# Altium schematic symbol library MCU_Microchip_ATmega.SchLib: 440 symbols (part 6 of 9)
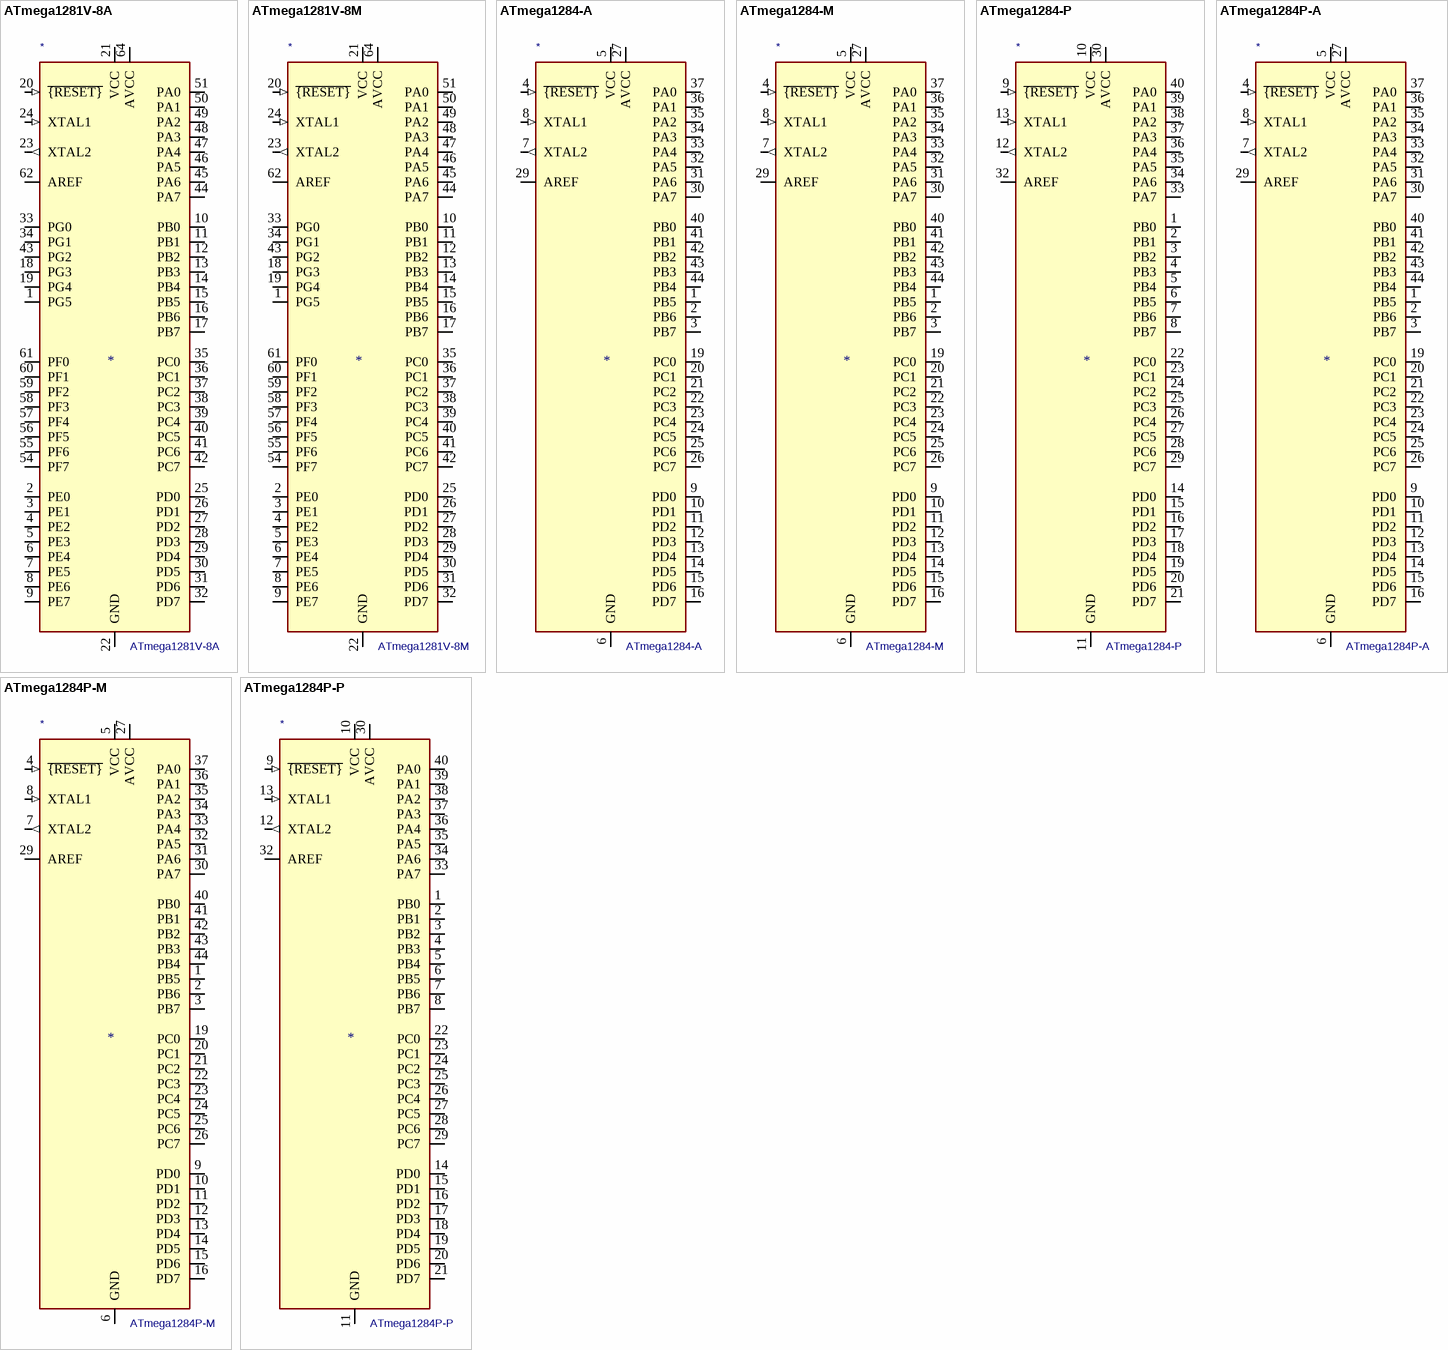
[diagram p45: symbols ATmega1281V-8A to ATmega1284P-P]

## ATmega1284P-P
designator *  value ATmega1284P-P
ki_keywords: AVR 8bit Microcontroller MegaAVR PicoPower; ki_description: 20MHz, 128kB Flash, 16kB SRAM, 4kB EEPROM, JTAG, DIP-40; ki_fp_filters: DIP*W15.24mm*; Footprint: Package_DIP:DIP-40_W15.24mm; Supplier: http://ww1.microchip.com/downloads/en/DeviceDoc/Atmel-8272-8-bit-AVR-microcontroller-ATmega164A_PA-324A_PA-644A_PA-1284_P_datasheet.pdf
footprint DIP-40_W15.24mm
pins: 1 PB0 (io), 2 PB1 (io), 3 PB2 (io), 4 PB3 (io), 5 PB4 (io), 6 PB5 (io), 7 PB6 (io), 8 PB7 (io), 9 ~{{RESET}} (in), 10 VCC (power), 11 GND (power), 12 XTAL2 (out), 13 XTAL1 (in), 14 PD0 (io), 15 PD1 (io), 16 PD2 (io), 17 PD3 (io), 18 PD4 (io), 19 PD5 (io), 20 PD6 (io), 21 PD7 (io), 22 PC0 (io), 23 PC1 (io), 24 PC2 (io), 25 PC3 (io), 26 PC4 (io), 27 PC5 (io), 28 PC6 (io), 29 PC7 (io), 30 AVCC (power), 31 GND hidden, 32 AREF, 33 PA7 (io), 34 PA6 (io), 35 PA5 (io), 36 PA4 (io), 37 PA3 (io), 38 PA2 (io), 39 PA1 (io), 40 PA0 (io)

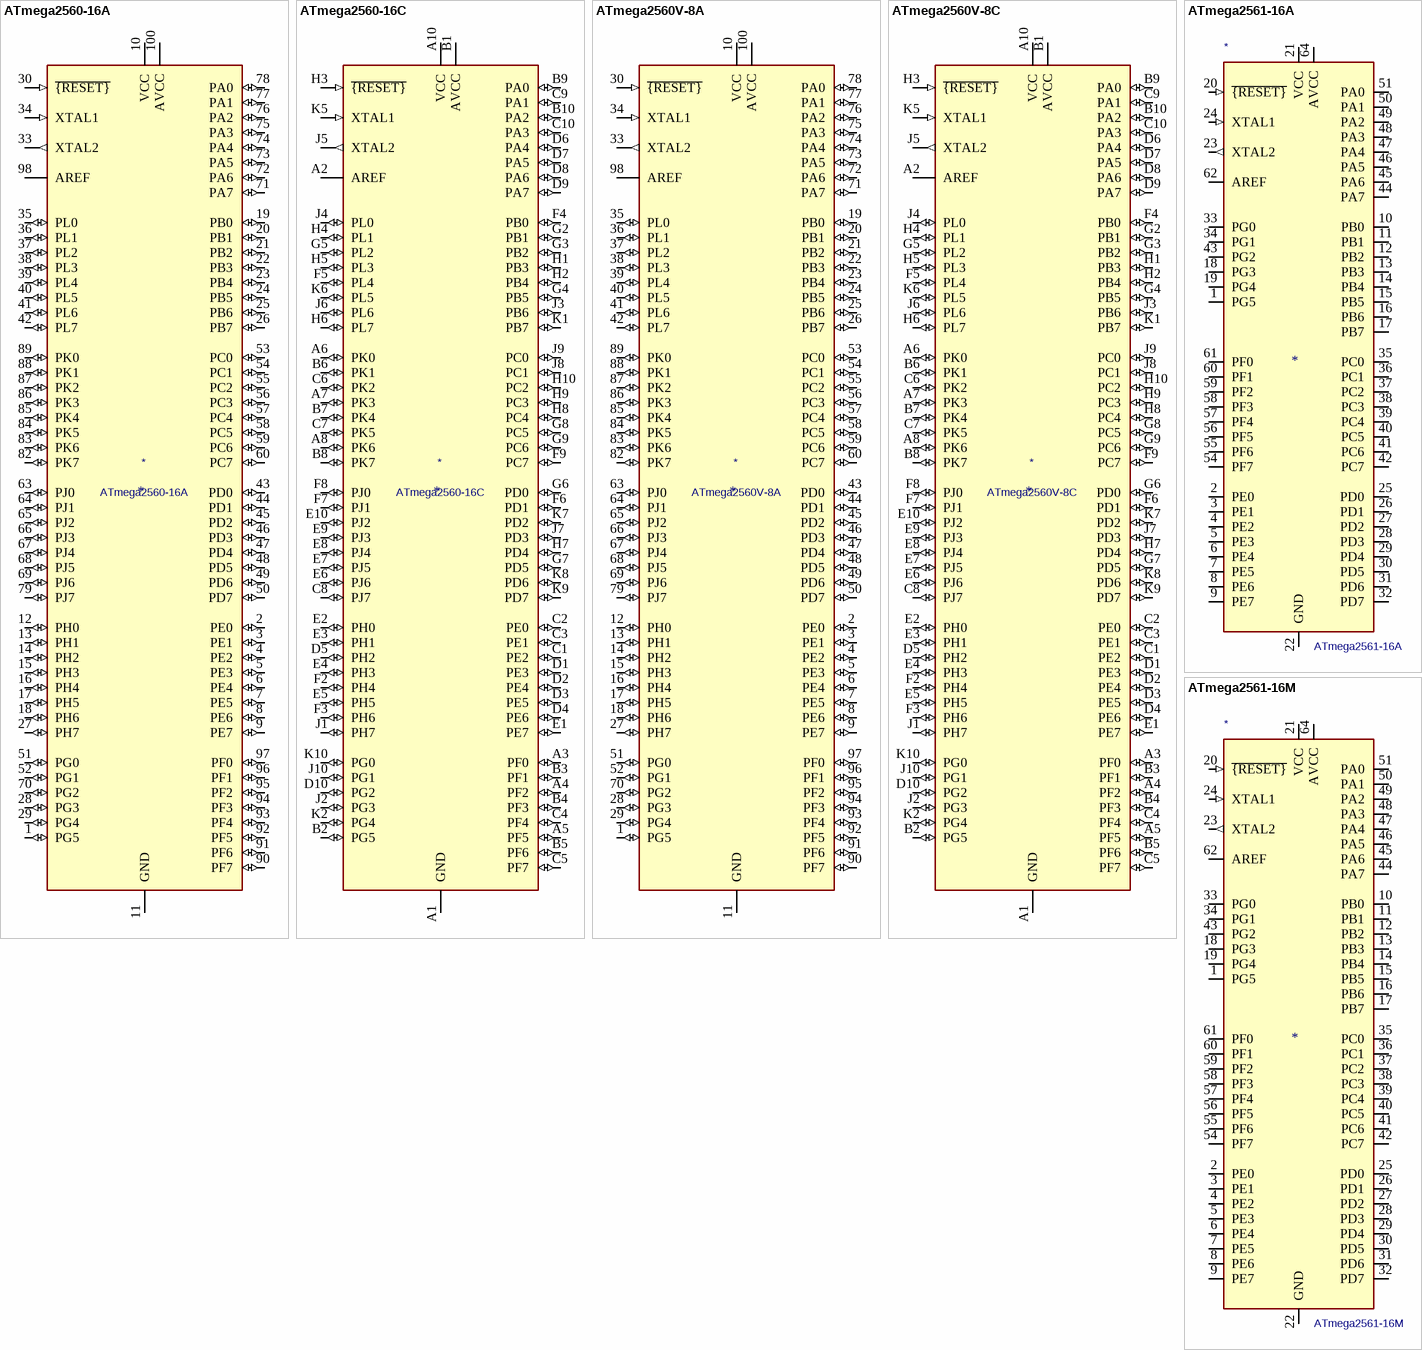
[diagram p24: symbols ATmega2560-16A to ATmega2561-16M]

## ATmega2560-16A
designator *  value ATmega2560-16A
ki_keywords: AVR 8bit Microcontroller MegaAVR; ki_description: 16MHz, 256kB Flash, 8kB SRAM, 4kB EEPROM, JTAG, TQFP-100; ki_fp_filters: TQFP*14x14mm*P0.5mm*; Footprint: Package_QFP:TQFP-100_14x14mm_P0.5mm; Supplier: http://ww1.microchip.com/downloads/en/DeviceDoc/Atmel-2549-8-bit-AVR-Microcontroller-ATmega640-1280-1281-2560-2561_datasheet.pdf
footprint TQFP-100_14x14mm_P0.5mm
pins: 1 PG5 (io), 2 PE0 (io), 3 PE1 (io), 4 PE2 (io), 5 PE3 (io), 6 PE4 (io), 7 PE5 (io), 8 PE6 (io), 9 PE7 (io), 10 VCC (power), 11 GND (power), 12 PH0 (io), 13 PH1 (io), 14 PH2 (io), 15 PH3 (io), 16 PH4 (io), 17 PH5 (io), 18 PH6 (io), 19 PB0 (io), 20 PB1 (io), 21 PB2 (io), 22 PB3 (io), 23 PB4 (io), 24 PB5 (io), 25 PB6 (io), 26 PB7 (io), 27 PH7 (io), 28 PG3 (io), 29 PG4 (io), 30 ~{{RESET}} (in), 31 VCC hidden, 32 GND hidden, 33 XTAL2 (out), 34 XTAL1 (in), 35 PL0 (io), 36 PL1 (io), 37 PL2 (io), 38 PL3 (io), 39 PL4 (io), 40 PL5 (io), 41 PL6 (io), 42 PL7 (io), 43 PD0 (io), 44 PD1 (io), 45 PD2 (io), 46 PD3 (io), 47 PD4 (io), 48 PD5 (io), 49 PD6 (io), 50 PD7 (io), 51 PG0 (io), 52 PG1 (io), 53 PC0 (io), 54 PC1 (io), 55 PC2 (io), 56 PC3 (io), 57 PC4 (io), 58 PC5 (io), 59 PC6 (io), 60 PC7 (io), 61 VCC hidden, 62 GND hidden, 63 PJ0 (io), 64 PJ1 (io), 65 PJ2 (io), 66 PJ3 (io), 67 PJ4 (io), 68 PJ5 (io), 69 PJ6 (io), 70 PG2 (io), 71 PA7 (io), 72 PA6 (io), 73 PA5 (io), 74 PA4 (io), 75 PA3 (io), 76 PA2 (io), 77 PA1 (io), 78 PA0 (io), 79 PJ7 (io), 80 VCC hidden, 81 GND hidden, 82 PK7 (io), 83 PK6 (io), 84 PK5 (io), 85 PK4 (io), 86 PK3 (io), 87 PK2 (io), 88 PK1 (io), 89 PK0 (io), 90 PF7 (io), 91 PF6 (io), 92 PF5 (io), 93 PF4 (io), 94 PF3 (io), 95 PF2 (io), 96 PF1 (io), 97 PF0 (io), 98 AREF, 99 GND hidden, 100 AVCC (power)

## ATmega2560-16C
designator *  value ATmega2560-16C
ki_keywords: AVR 8bit Microcontroller MegaAVR; ki_description: 16MHz, 256kB Flash, 8kB SRAM, 4kB EEPROM, JTAG, TFBGA-100; ki_fp_filters: TFBGA*9.0x9.0mm*Layout10x10*P0.8mm*; Footprint: Package_BGA:TFBGA-100_9.0x9.0mm_Layout10x10_P0.8mm; Supplier: http://ww1.microchip.com/downloads/en/DeviceDoc/Atmel-2549-8-bit-AVR-Microcontroller-ATmega640-1280-1281-2560-2561_datasheet.pdf
footprint TFBGA-100_9.0x9.0mm_Layout10x10_P0.8mm
pins: A1 GND (power), A2 AREF, A3 PF0 (io), A4 PF2 (io), A5 PF5 (io), A6 PK0 (io), A7 PK3 (io), A8 PK6 (io), A9 GND hidden, A10 VCC (power), B1 AVCC (power), B2 PG5 (io), B3 PF1 (io), B4 PF3 (io), B5 PF6 (io), B6 PK1 (io), B7 PK4 (io), B8 PK7 (io), B9 PA0 (io), B10 PA2 (io), C1 PE2 (io), C2 PE0 (io), C3 PE1 (io), C4 PF4 (io), C5 PF7 (io), C6 PK2 (io), C7 PK5 (io), C8 PJ7 (io), C9 PA1 (io), C10 PA3 (io), D1 PE3 (io), D2 PE4 (io), D3 PE5 (io), D4 PE6 (io), D5 PH2 (io), D6 PA4 (io), D7 PA5 (io), D8 PA6 (io), D9 PA7 (io), D10 PG2 (io), E1 PE7 (io), E2 PH0 (io), E3 PH1 (io), E4 PH3 (io), E5 PH5 (io), E6 PJ6 (io), E7 PJ5 (io), E8 PJ4 (io), E9 PJ3 (io), E10 PJ2 (io), F1 VCC hidden, F2 PH4 (io), F3 PH6 (io), F4 PB0 (io), F5 PL4 (io), F6 PD1 (io), F7 PJ1 (io), F8 PJ0 (io), F9 PC7 (io), F10 GND hidden, G1 GND hidden, G2 PB1 (io), G3 PB2 (io), G4 PB5 (io), G5 PL2 (io), G6 PD0 (io), G7 PD5 (io), G8 PC5 (io), G9 PC6 (io), G10 VCC hidden, H1 PB3 (io), H2 PB4 (io), H3 ~{{RESET}} (in), H4 PL1 (io), H5 PL3 (io), H6 PL7 (io), H7 PD4 (io), H8 PC4 (io), H9 PC3 (io), H10 PC2 (io), J1 PH7 (io), J2 PG3 (io), J3 PB6 (io), J4 PL0 (io), J5 XTAL2 (out), J6 PL6 (io), J7 PD3 (io), J8 PC1 (io), J9 PC0 (io), J10 PG1 (io), K1 PB7 (io), K2 PG4 (io), K3 VCC hidden, K4 GND hidden, K5 XTAL1 (in), K6 PL5 (io), K7 PD2 (io), K8 PD6 (io), K9 PD7 (io), K10 PG0 (io)

## ATmega2560V-8A
designator *  value ATmega2560V-8A
ki_keywords: AVR 8bit Microcontroller MegaAVR; ki_description: 8MHz, 256kB Flash, 8kB SRAM, 4kB EEPROM, JTAG, TQFP-100; ki_fp_filters: TQFP*14x14mm*P0.5mm*; Footprint: Package_QFP:TQFP-100_14x14mm_P0.5mm; Supplier: http://ww1.microchip.com/downloads/en/DeviceDoc/Atmel-2549-8-bit-AVR-Microcontroller-ATmega640-1280-1281-2560-2561_datasheet.pdf
footprint TQFP-100_14x14mm_P0.5mm
pins: 1 PG5 (io), 2 PE0 (io), 3 PE1 (io), 4 PE2 (io), 5 PE3 (io), 6 PE4 (io), 7 PE5 (io), 8 PE6 (io), 9 PE7 (io), 10 VCC (power), 11 GND (power), 12 PH0 (io), 13 PH1 (io), 14 PH2 (io), 15 PH3 (io), 16 PH4 (io), 17 PH5 (io), 18 PH6 (io), 19 PB0 (io), 20 PB1 (io), 21 PB2 (io), 22 PB3 (io), 23 PB4 (io), 24 PB5 (io), 25 PB6 (io), 26 PB7 (io), 27 PH7 (io), 28 PG3 (io), 29 PG4 (io), 30 ~{{RESET}} (in), 31 VCC hidden, 32 GND hidden, 33 XTAL2 (out), 34 XTAL1 (in), 35 PL0 (io), 36 PL1 (io), 37 PL2 (io), 38 PL3 (io), 39 PL4 (io), 40 PL5 (io), 41 PL6 (io), 42 PL7 (io), 43 PD0 (io), 44 PD1 (io), 45 PD2 (io), 46 PD3 (io), 47 PD4 (io), 48 PD5 (io), 49 PD6 (io), 50 PD7 (io), 51 PG0 (io), 52 PG1 (io), 53 PC0 (io), 54 PC1 (io), 55 PC2 (io), 56 PC3 (io), 57 PC4 (io), 58 PC5 (io), 59 PC6 (io), 60 PC7 (io), 61 VCC hidden, 62 GND hidden, 63 PJ0 (io), 64 PJ1 (io), 65 PJ2 (io), 66 PJ3 (io), 67 PJ4 (io), 68 PJ5 (io), 69 PJ6 (io), 70 PG2 (io), 71 PA7 (io), 72 PA6 (io), 73 PA5 (io), 74 PA4 (io), 75 PA3 (io), 76 PA2 (io), 77 PA1 (io), 78 PA0 (io), 79 PJ7 (io), 80 VCC hidden, 81 GND hidden, 82 PK7 (io), 83 PK6 (io), 84 PK5 (io), 85 PK4 (io), 86 PK3 (io), 87 PK2 (io), 88 PK1 (io), 89 PK0 (io), 90 PF7 (io), 91 PF6 (io), 92 PF5 (io), 93 PF4 (io), 94 PF3 (io), 95 PF2 (io), 96 PF1 (io), 97 PF0 (io), 98 AREF, 99 GND hidden, 100 AVCC (power)

## ATmega2560V-8C
designator *  value ATmega2560V-8C
ki_keywords: AVR 8bit Microcontroller MegaAVR; ki_description: 8MHz, 256kB Flash, 8kB SRAM, 4kB EEPROM, JTAG, TFBGA-100; ki_fp_filters: TFBGA*9.0x9.0mm*Layout10x10*P0.8mm*; Footprint: Package_BGA:TFBGA-100_9.0x9.0mm_Layout10x10_P0.8mm; Supplier: http://ww1.microchip.com/downloads/en/DeviceDoc/Atmel-2549-8-bit-AVR-Microcontroller-ATmega640-1280-1281-2560-2561_datasheet.pdf
footprint TFBGA-100_9.0x9.0mm_Layout10x10_P0.8mm
pins: A1 GND (power), A2 AREF, A3 PF0 (io), A4 PF2 (io), A5 PF5 (io), A6 PK0 (io), A7 PK3 (io), A8 PK6 (io), A9 GND hidden, A10 VCC (power), B1 AVCC (power), B2 PG5 (io), B3 PF1 (io), B4 PF3 (io), B5 PF6 (io), B6 PK1 (io), B7 PK4 (io), B8 PK7 (io), B9 PA0 (io), B10 PA2 (io), C1 PE2 (io), C2 PE0 (io), C3 PE1 (io), C4 PF4 (io), C5 PF7 (io), C6 PK2 (io), C7 PK5 (io), C8 PJ7 (io), C9 PA1 (io), C10 PA3 (io), D1 PE3 (io), D2 PE4 (io), D3 PE5 (io), D4 PE6 (io), D5 PH2 (io), D6 PA4 (io), D7 PA5 (io), D8 PA6 (io), D9 PA7 (io), D10 PG2 (io), E1 PE7 (io), E2 PH0 (io), E3 PH1 (io), E4 PH3 (io), E5 PH5 (io), E6 PJ6 (io), E7 PJ5 (io), E8 PJ4 (io), E9 PJ3 (io), E10 PJ2 (io), F1 VCC hidden, F2 PH4 (io), F3 PH6 (io), F4 PB0 (io), F5 PL4 (io), F6 PD1 (io), F7 PJ1 (io), F8 PJ0 (io), F9 PC7 (io), F10 GND hidden, G1 GND hidden, G2 PB1 (io), G3 PB2 (io), G4 PB5 (io), G5 PL2 (io), G6 PD0 (io), G7 PD5 (io), G8 PC5 (io), G9 PC6 (io), G10 VCC hidden, H1 PB3 (io), H2 PB4 (io), H3 ~{{RESET}} (in), H4 PL1 (io), H5 PL3 (io), H6 PL7 (io), H7 PD4 (io), H8 PC4 (io), H9 PC3 (io), H10 PC2 (io), J1 PH7 (io), J2 PG3 (io), J3 PB6 (io), J4 PL0 (io), J5 XTAL2 (out), J6 PL6 (io), J7 PD3 (io), J8 PC1 (io), J9 PC0 (io), J10 PG1 (io), K1 PB7 (io), K2 PG4 (io), K3 VCC hidden, K4 GND hidden, K5 XTAL1 (in), K6 PL5 (io), K7 PD2 (io), K8 PD6 (io), K9 PD7 (io), K10 PG0 (io)

## ATmega2561-16A
designator *  value ATmega2561-16A
ki_keywords: AVR 8bit Microcontroller MegaAVR; ki_description: 16MHz, 256kB Flash, 8kB SRAM, 4kB EEPROM, JTAG, TQFP-64; ki_fp_filters: TQFP*14x14mm*P0.8mm*; Footprint: Package_QFP:TQFP-64_14x14mm_P0.8mm; Supplier: http://ww1.microchip.com/downloads/en/DeviceDoc/Atmel-2549-8-bit-AVR-Microcontroller-ATmega640-1280-1281-2560-2561_datasheet.pdf
footprint TQFP-64_14x14mm_P0.8mm
pins: 1 PG5 (io), 2 PE0 (io), 3 PE1 (io), 4 PE2 (io), 5 PE3 (io), 6 PE4 (io), 7 PE5 (io), 8 PE6 (io), 9 PE7 (io), 10 PB0 (io), 11 PB1 (io), 12 PB2 (io), 13 PB3 (io), 14 PB4 (io), 15 PB5 (io), 16 PB6 (io), 17 PB7 (io), 18 PG3 (io), 19 PG4 (io), 20 ~{{RESET}} (in), 21 VCC (power), 22 GND (power), 23 XTAL2 (out), 24 XTAL1 (in), 25 PD0 (io), 26 PD1 (io), 27 PD2 (io), 28 PD3 (io), 29 PD4 (io), 30 PD5 (io), 31 PD6 (io), 32 PD7 (io), 33 PG0 (io), 34 PG1 (io), 35 PC0 (io), 36 PC1 (io), 37 PC2 (io), 38 PC3 (io), 39 PC4 (io), 40 PC5 (io), 41 PC6 (io), 42 PC7 (io), 43 PG2 (io), 44 PA7 (io), 45 PA6 (io), 46 PA5 (io), 47 PA4 (io), 48 PA3 (io), 49 PA2 (io), 50 PA1 (io), 51 PA0 (io), 52 VCC hidden, 53 GND hidden, 54 PF7 (io), 55 PF6 (io), 56 PF5 (io), 57 PF4 (io), 58 PF3 (io), 59 PF2 (io), 60 PF1 (io), 61 PF0 (io), 62 AREF, 63 GND hidden, 64 AVCC (power)

## ATmega2561-16M
designator *  value ATmega2561-16M
ki_keywords: AVR 8bit Microcontroller MegaAVR; ki_description: 16MHz, 256kB Flash, 8kB SRAM, 4kB EEPROM, JTAG, QFN-64; ki_fp_filters: QFN*1EP*9x9mm*P0.5mm*; Footprint: Package_DFN_QFN:QFN-64-1EP_9x9mm_P0.5mm_EP7.65x7.65mm; Supplier: http://ww1.microchip.com/downloads/en/DeviceDoc/Atmel-2549-8-bit-AVR-Microcontroller-ATmega640-1280-1281-2560-2561_datasheet.pdf
footprint QFN-64-1EP_9x9mm_P0.5mm_EP7.65x7.65mm
pins: 1 PG5 (io), 2 PE0 (io), 3 PE1 (io), 4 PE2 (io), 5 PE3 (io), 6 PE4 (io), 7 PE5 (io), 8 PE6 (io), 9 PE7 (io), 10 PB0 (io), 11 PB1 (io), 12 PB2 (io), 13 PB3 (io), 14 PB4 (io), 15 PB5 (io), 16 PB6 (io), 17 PB7 (io), 18 PG3 (io), 19 PG4 (io), 20 ~{{RESET}} (in), 21 VCC (power), 22 GND (power), 23 XTAL2 (out), 24 XTAL1 (in), 25 PD0 (io), 26 PD1 (io), 27 PD2 (io), 28 PD3 (io), 29 PD4 (io), 30 PD5 (io), 31 PD6 (io), 32 PD7 (io), 33 PG0 (io), 34 PG1 (io), 35 PC0 (io), 36 PC1 (io), 37 PC2 (io), 38 PC3 (io), 39 PC4 (io), 40 PC5 (io), 41 PC6 (io), 42 PC7 (io), 43 PG2 (io), 44 PA7 (io), 45 PA6 (io), 46 PA5 (io), 47 PA4 (io), 48 PA3 (io), 49 PA2 (io), 50 PA1 (io), 51 PA0 (io), 52 VCC hidden, 53 GND hidden, 54 PF7 (io), 55 PF6 (io), 56 PF5 (io), 57 PF4 (io), 58 PF3 (io), 59 PF2 (io), 60 PF1 (io), 61 PF0 (io), 62 AREF, 63 GND hidden, 64 AVCC (power), 65 GND hidden

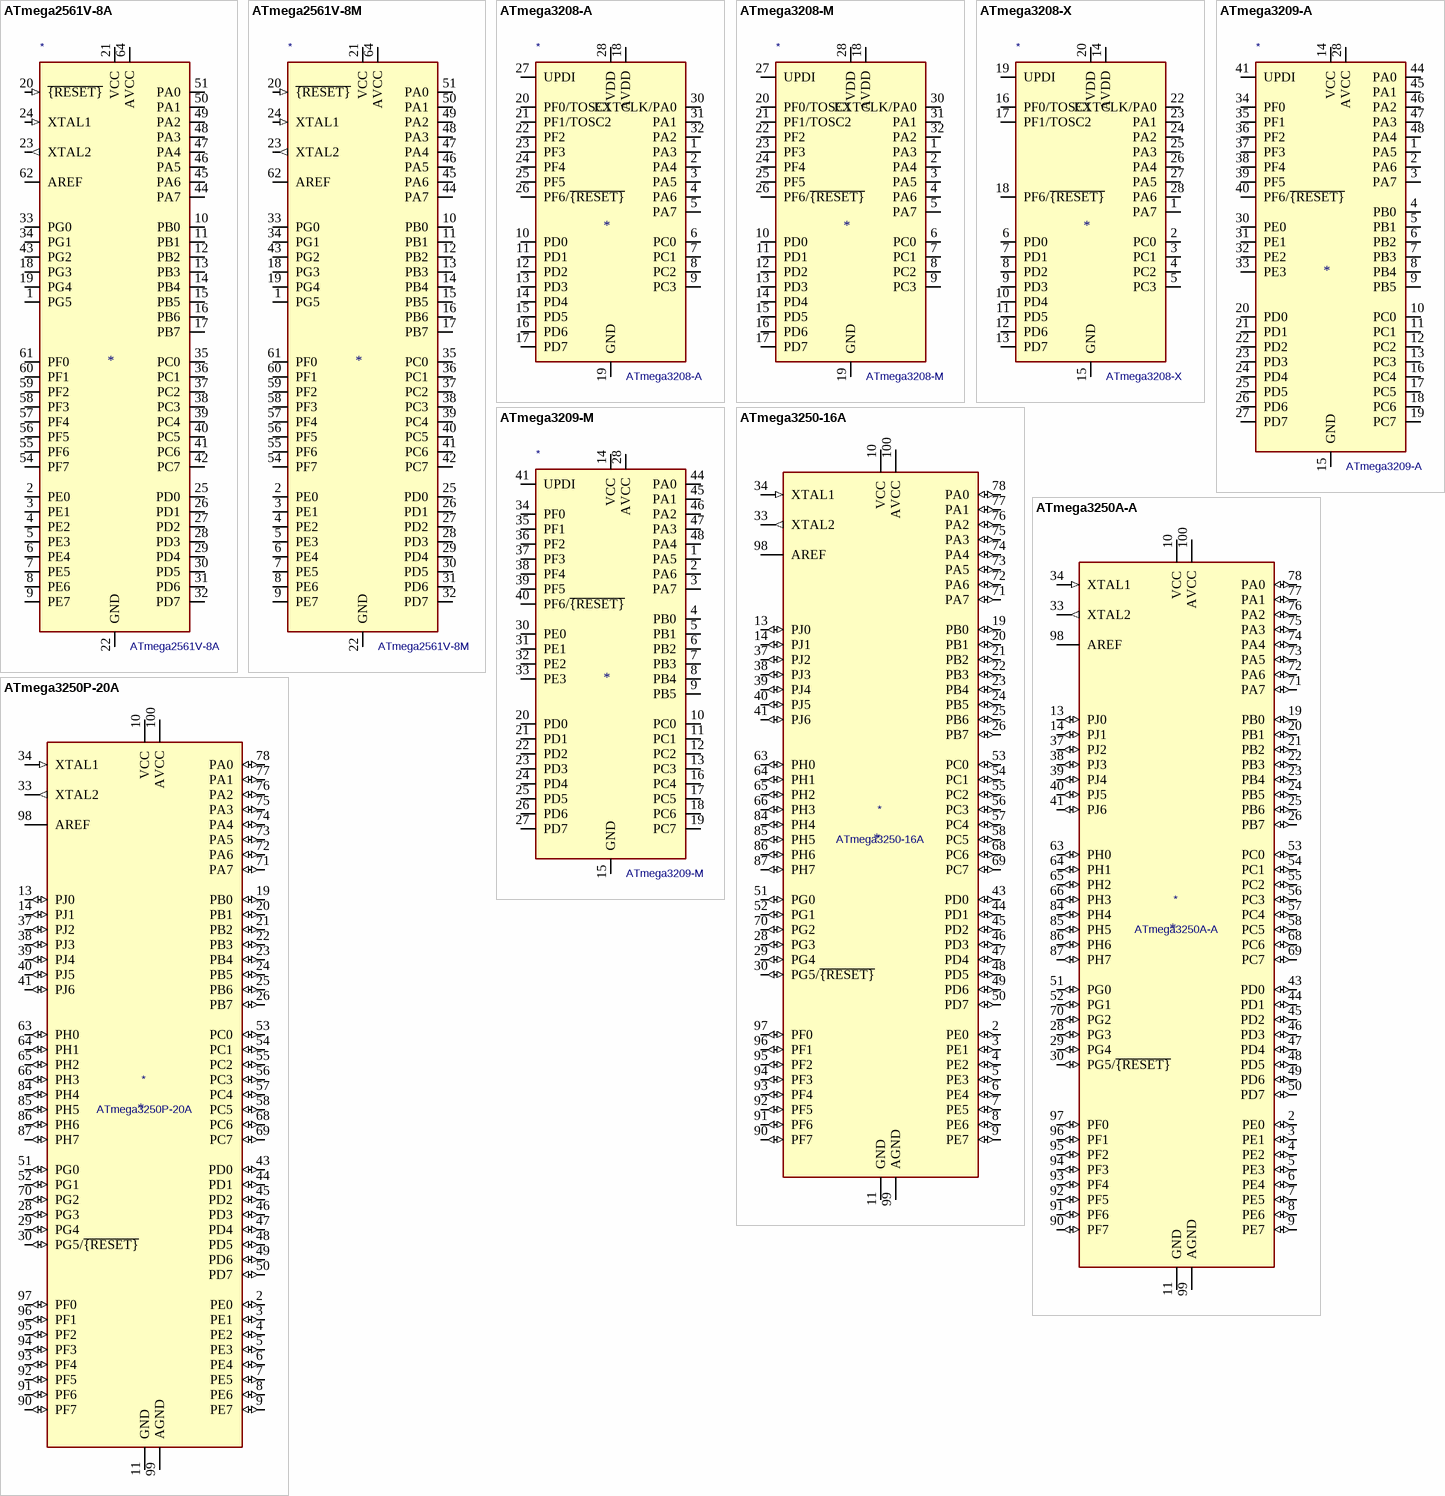
[diagram p25: symbols ATmega2561V-8A to ATmega3250P-20A]

## ATmega2561V-8A
designator *  value ATmega2561V-8A
ki_keywords: AVR 8bit Microcontroller MegaAVR; ki_description: 8MHz, 256kB Flash, 8kB SRAM, 4kB EEPROM, JTAG, TQFP-64; ki_fp_filters: TQFP*14x14mm*P0.8mm*; Footprint: Package_QFP:TQFP-64_14x14mm_P0.8mm; Supplier: http://ww1.microchip.com/downloads/en/DeviceDoc/Atmel-2549-8-bit-AVR-Microcontroller-ATmega640-1280-1281-2560-2561_datasheet.pdf
footprint TQFP-64_14x14mm_P0.8mm
pins: 1 PG5 (io), 2 PE0 (io), 3 PE1 (io), 4 PE2 (io), 5 PE3 (io), 6 PE4 (io), 7 PE5 (io), 8 PE6 (io), 9 PE7 (io), 10 PB0 (io), 11 PB1 (io), 12 PB2 (io), 13 PB3 (io), 14 PB4 (io), 15 PB5 (io), 16 PB6 (io), 17 PB7 (io), 18 PG3 (io), 19 PG4 (io), 20 ~{{RESET}} (in), 21 VCC (power), 22 GND (power), 23 XTAL2 (out), 24 XTAL1 (in), 25 PD0 (io), 26 PD1 (io), 27 PD2 (io), 28 PD3 (io), 29 PD4 (io), 30 PD5 (io), 31 PD6 (io), 32 PD7 (io), 33 PG0 (io), 34 PG1 (io), 35 PC0 (io), 36 PC1 (io), 37 PC2 (io), 38 PC3 (io), 39 PC4 (io), 40 PC5 (io), 41 PC6 (io), 42 PC7 (io), 43 PG2 (io), 44 PA7 (io), 45 PA6 (io), 46 PA5 (io), 47 PA4 (io), 48 PA3 (io), 49 PA2 (io), 50 PA1 (io), 51 PA0 (io), 52 VCC hidden, 53 GND hidden, 54 PF7 (io), 55 PF6 (io), 56 PF5 (io), 57 PF4 (io), 58 PF3 (io), 59 PF2 (io), 60 PF1 (io), 61 PF0 (io), 62 AREF, 63 GND hidden, 64 AVCC (power)

## ATmega2561V-8M
designator *  value ATmega2561V-8M
ki_keywords: AVR 8bit Microcontroller MegaAVR; ki_description: 8MHz, 256kB Flash, 8kB SRAM, 4kB EEPROM, JTAG, QFN-64; ki_fp_filters: QFN*1EP*9x9mm*P0.5mm*; Footprint: Package_DFN_QFN:QFN-64-1EP_9x9mm_P0.5mm_EP7.65x7.65mm; Supplier: http://ww1.microchip.com/downloads/en/DeviceDoc/Atmel-2549-8-bit-AVR-Microcontroller-ATmega640-1280-1281-2560-2561_datasheet.pdf
footprint QFN-64-1EP_9x9mm_P0.5mm_EP7.65x7.65mm
pins: 1 PG5 (io), 2 PE0 (io), 3 PE1 (io), 4 PE2 (io), 5 PE3 (io), 6 PE4 (io), 7 PE5 (io), 8 PE6 (io), 9 PE7 (io), 10 PB0 (io), 11 PB1 (io), 12 PB2 (io), 13 PB3 (io), 14 PB4 (io), 15 PB5 (io), 16 PB6 (io), 17 PB7 (io), 18 PG3 (io), 19 PG4 (io), 20 ~{{RESET}} (in), 21 VCC (power), 22 GND (power), 23 XTAL2 (out), 24 XTAL1 (in), 25 PD0 (io), 26 PD1 (io), 27 PD2 (io), 28 PD3 (io), 29 PD4 (io), 30 PD5 (io), 31 PD6 (io), 32 PD7 (io), 33 PG0 (io), 34 PG1 (io), 35 PC0 (io), 36 PC1 (io), 37 PC2 (io), 38 PC3 (io), 39 PC4 (io), 40 PC5 (io), 41 PC6 (io), 42 PC7 (io), 43 PG2 (io), 44 PA7 (io), 45 PA6 (io), 46 PA5 (io), 47 PA4 (io), 48 PA3 (io), 49 PA2 (io), 50 PA1 (io), 51 PA0 (io), 52 VCC hidden, 53 GND hidden, 54 PF7 (io), 55 PF6 (io), 56 PF5 (io), 57 PF4 (io), 58 PF3 (io), 59 PF2 (io), 60 PF1 (io), 61 PF0 (io), 62 AREF, 63 GND hidden, 64 AVCC (power), 65 GND hidden

## ATmega3208-A
designator *  value ATmega3208-A
ki_keywords: AVR 8bit Microcontroller MegaAVR; ki_description: 20MHz, 32kB Flash, 4kB SRAM, 256B EEPROM, TQFP-32; ki_fp_filters: TQFP*7x7mm*P0.8mm*; Footprint: Package_QFP:TQFP-32_7x7mm_P0.8mm; Supplier: http://ww1.microchip.com/downloads/en/DeviceDoc/40002017A.pdf
footprint TQFP-32_7x7mm_P0.8mm
pins: 1 PA3 (io), 2 PA4 (io), 3 PA5 (io), 4 PA6 (io), 5 PA7 (io), 6 PC0 (io), 7 PC1 (io), 8 PC2 (io), 9 PC3 (io), 10 PD0 (io), 11 PD1 (io), 12 PD2 (io), 13 PD3 (io), 14 PD4 (io), 15 PD5 (io), 16 PD6 (io), 17 PD7 (io), 18 AVDD (power), 19 GND (power), 20 PF0/TOSC1 (io), 21 PF1/TOSC2 (io), 22 PF2 (io), 23 PF3 (io), 24 PF4 (io), 25 PF5 (io), 26 PF6/~{{RESET}} (io), 27 UPDI (io), 28 VDD (power), 29 GND hidden, 30 EXTCLK/PA0 (io), 31 PA1 (io), 32 PA2 (io)

## ATmega3208-M
designator *  value ATmega3208-M
ki_keywords: AVR 8bit Microcontroller MegaAVR; ki_description: 20MHz, 32kB Flash, 4kB SRAM, 256B EEPROM, VQFN-32; ki_fp_filters: QFN*1EP*5x5mm*P0.5mm*; Footprint: Package_DFN_QFN:QFN-32-1EP_5x5mm_P0.5mm_EP3.1x3.1mm_ThermalVias; Supplier: http://ww1.microchip.com/downloads/en/DeviceDoc/40002017A.pdf
footprint QFN-32-1EP_5x5mm_P0.5mm_EP3.1x3.1mm_ThermalVias
pins: 1 PA3 (io), 2 PA4 (io), 3 PA5 (io), 4 PA6 (io), 5 PA7 (io), 6 PC0 (io), 7 PC1 (io), 8 PC2 (io), 9 PC3 (io), 10 PD0 (io), 11 PD1 (io), 12 PD2 (io), 13 PD3 (io), 14 PD4 (io), 15 PD5 (io), 16 PD6 (io), 17 PD7 (io), 18 AVDD (power), 19 GND (power), 20 PF0/TOSC1 (io), 21 PF1/TOSC2 (io), 22 PF2 (io), 23 PF3 (io), 24 PF4 (io), 25 PF5 (io), 26 PF6/~{{RESET}} (io), 27 UPDI (io), 28 VDD (power), 29 GND hidden, 30 EXTCLK/PA0 (io), 31 PA1 (io), 32 PA2 (io), 33 GND hidden

## ATmega3208-X
designator *  value ATmega3208-X
ki_keywords: AVR 8bit Microcontroller MegaAVR; ki_description: 20MHz, 32kB Flash, 4kB SRAM, 256B EEPROM, SSOP-28; ki_fp_filters: SSOP*5.3x10.2mm*P0.65mm*; Footprint: Package_SO:SSOP-28_5.3x10.2mm_P0.65mm; Supplier: http://ww1.microchip.com/downloads/en/DeviceDoc/40002018A.pdf
footprint SSOP-28_5.3x10.2mm_P0.65mm
pins: 1 PA7 (io), 2 PC0 (io), 3 PC1 (io), 4 PC2 (io), 5 PC3 (io), 6 PD0 (io), 7 PD1 (io), 8 PD2 (io), 9 PD3 (io), 10 PD4 (io), 11 PD5 (io), 12 PD6 (io), 13 PD7 (io), 14 AVDD (power), 15 GND (power), 16 PF0/TOSC1 (io), 17 PF1/TOSC2 (io), 18 PF6/~{{RESET}} (io), 19 UPDI (io), 20 VDD (power), 21 GND hidden, 22 EXTCLK/PA0 (io), 23 PA1 (io), 24 PA2 (io), 25 PA3 (io), 26 PA4 (io), 27 PA5 (io), 28 PA6 (io)

## ATmega3209-A
designator *  value ATmega3209-A
ki_keywords: AVR 8bit Microcontroller MegaAVR; ki_description: 20MHz, 32kB Flash, 4kB SRAM, 256B EEPROM, TQFP-48; ki_fp_filters: TQFP*7x7mm*P0.5mm*; Footprint: Package_QFP:TQFP-48_7x7mm_P0.5mm; Supplier: http://ww1.microchip.com/downloads/en/DeviceDoc/40002016A.pdf
footprint TQFP-48_7x7mm_P0.5mm
pins: 1 PA5 (io), 2 PA6 (io), 3 PA7 (io), 4 PB0 (io), 5 PB1 (io), 6 PB2 (io), 7 PB3 (io), 8 PB4 (io), 9 PB5 (io), 10 PC0 (io), 11 PC1 (io), 12 PC2 (io), 13 PC3 (io), 14 VCC (power), 15 GND (power), 16 PC4 (io), 17 PC5 (io), 18 PC6 (io), 19 PC7 (io), 20 PD0 (io), 21 PD1 (io), 22 PD2 (io), 23 PD3 (io), 24 PD4 (io), 25 PD5 (io), 26 PD6 (io), 27 PD7 (io), 28 AVCC (power), 29 GND hidden, 30 PE0 (io), 31 PE1 (io), 32 PE2 (io), 33 PE3 (io), 34 PF0 (io), 35 PF1 (io), 36 PF2 (io), 37 PF3 (io), 38 PF4 (io), 39 PF5 (io), 40 PF6/~{{RESET}} (io), 41 UPDI (io), 42 VCC hidden, 43 GND hidden, 44 PA0 (io), 45 PA1 (io), 46 PA2 (io), 47 PA3 (io), 48 PA4 (io)

## ATmega3209-M
designator *  value ATmega3209-M
ki_keywords: AVR 8bit Microcontroller MegaAVR; ki_description: 20MHz, 32kB Flash, 4kB SRAM, 256B EEPROM, UQFN-48; ki_fp_filters: UQFN*1EP*6x6mm*P0.4mm*; Footprint: Package_DFN_QFN:UQFN-48-1EP_6x6mm_P0.4mm_EP4.62x4.62mm; Supplier: http://ww1.microchip.com/downloads/en/DeviceDoc/40002016A.pdf
footprint UQFN-48-1EP_6x6mm_P0.4mm_EP4.62x4.62mm
pins: 1 PA5 (io), 2 PA6 (io), 3 PA7 (io), 4 PB0 (io), 5 PB1 (io), 6 PB2 (io), 7 PB3 (io), 8 PB4 (io), 9 PB5 (io), 10 PC0 (io), 11 PC1 (io), 12 PC2 (io), 13 PC3 (io), 14 VCC (power), 15 GND (power), 16 PC4 (io), 17 PC5 (io), 18 PC6 (io), 19 PC7 (io), 20 PD0 (io), 21 PD1 (io), 22 PD2 (io), 23 PD3 (io), 24 PD4 (io), 25 PD5 (io), 26 PD6 (io), 27 PD7 (io), 28 AVCC (power), 29 GND hidden, 30 PE0 (io), 31 PE1 (io), 32 PE2 (io), 33 PE3 (io), 34 PF0 (io), 35 PF1 (io), 36 PF2 (io), 37 PF3 (io), 38 PF4 (io), 39 PF5 (io), 40 PF6/~{{RESET}} (io), 41 UPDI (io), 42 VCC hidden, 43 GND hidden, 44 PA0 (io), 45 PA1 (io), 46 PA2 (io), 47 PA3 (io), 48 PA4 (io), 49 GND hidden

## ATmega3250-16A
designator *  value ATmega3250-16A
ki_keywords: AVR 8bit Microcontroller MegaAVR; ki_description: 16MHz, 32kB Flash, 2kB SRAM, 1kB EEPROM, JTAG, TQFP-100; ki_fp_filters: TQFP*14x14mm*P0.5mm*; Footprint: Package_QFP:TQFP-100_14x14mm_P0.5mm; Supplier: http://ww1.microchip.com/downloads/en/DeviceDoc/doc2570.pdf
footprint TQFP-100_14x14mm_P0.5mm
pins: 1 NC (in) hidden, 2 PE0 (io), 3 PE1 (io), 4 PE2 (io), 5 PE3 (io), 6 PE4 (io), 7 PE5 (io), 8 PE6 (io), 9 PE7 (io), 10 VCC (power), 11 GND (power), 12 NC (in) hidden, 13 PJ0 (io), 14 PJ1 (io), 15 NC (in) hidden, 16 NC (in) hidden, 17 NC (in) hidden, 18 NC (in) hidden, 19 PB0 (io), 20 PB1 (io), 21 PB2 (io), 22 PB3 (io), 23 PB4 (io), 24 PB5 (io), 25 PB6 (io), 26 PB7 (io), 27 NC (in) hidden, 28 PG3 (io), 29 PG4 (io), 30 PG5/~{{RESET}} (io), 31 VCC hidden, 32 GND hidden, 33 XTAL2 (out), 34 XTAL1 (in), 35 NC (in) hidden, 36 NC (in) hidden, 37 PJ2 (io), 38 PJ3 (io), 39 PJ4 (io), 40 PJ5 (io), 41 PJ6 (io), 42 NC (in) hidden, 43 PD0 (io), 44 PD1 (io), 45 PD2 (io), 46 PD3 (io), 47 PD4 (io), 48 PD5 (io), 49 PD6 (io), 50 PD7 (io), 51 PG0 (io), 52 PG1 (io), 53 PC0 (io), 54 PC1 (io), 55 PC2 (io), 56 PC3 (io), 57 PC4 (io), 58 PC5 (io), 59 NC (in) hidden, 60 NC (in) hidden, 61 NC (in) hidden, 62 NC (in) hidden, 63 PH0 (io), 64 PH1 (io), 65 PH2 (io), 66 PH3 (io), 67 NC (in) hidden, 68 PC6 (io), 69 PC7 (io), 70 PG2 (io), 71 PA7 (io), 72 PA6 (io), 73 PA5 (io), 74 PA4 (io), 75 PA3 (io), 76 PA2 (io), 77 PA1 (io), 78 PA0 (io), 79 NC (in) hidden, 80 VCC hidden, 81 GND hidden, 82 NC (in) hidden, 83 NC (in) hidden, 84 PH4 (io), 85 PH5 (io), 86 PH6 (io), 87 PH7 (io), 88 NC (in) hidden, 89 NC (in) hidden, 90 PF7 (io), 91 PF6 (io), 92 PF5 (io), 93 PF4 (io), 94 PF3 (io), 95 PF2 (io), 96 PF1 (io), 97 PF0 (io), 98 AREF, 99 AGND (power), 100 AVCC (power)

## ATmega3250A-A
designator *  value ATmega3250A-A
ki_keywords: AVR 8bit Microcontroller MegaAVR; ki_description: 20MHz, 32kB Flash, 2kB SRAM, 1kB EEPROM, JTAG, TQFP-100; ki_fp_filters: TQFP*14x14mm*P0.5mm*; Footprint: Package_QFP:TQFP-100_14x14mm_P0.5mm; Supplier: http://ww1.microchip.com/downloads/en/DeviceDoc/atmel-8285-8-bit-avr-microcontroller-atmega165a_pa_325a_pa_3250a_pa_645a_p_6450a_p_datasheet.pdf
footprint TQFP-100_14x14mm_P0.5mm
pins: 1 NC (in) hidden, 2 PE0 (io), 3 PE1 (io), 4 PE2 (io), 5 PE3 (io), 6 PE4 (io), 7 PE5 (io), 8 PE6 (io), 9 PE7 (io), 10 VCC (power), 11 GND (power), 12 NC (in) hidden, 13 PJ0 (io), 14 PJ1 (io), 15 NC (in) hidden, 16 NC (in) hidden, 17 NC (in) hidden, 18 NC (in) hidden, 19 PB0 (io), 20 PB1 (io), 21 PB2 (io), 22 PB3 (io), 23 PB4 (io), 24 PB5 (io), 25 PB6 (io), 26 PB7 (io), 27 NC (in) hidden, 28 PG3 (io), 29 PG4 (io), 30 PG5/~{{RESET}} (io), 31 VCC hidden, 32 GND hidden, 33 XTAL2 (out), 34 XTAL1 (in), 35 NC (in) hidden, 36 NC (in) hidden, 37 PJ2 (io), 38 PJ3 (io), 39 PJ4 (io), 40 PJ5 (io), 41 PJ6 (io), 42 NC (in) hidden, 43 PD0 (io), 44 PD1 (io), 45 PD2 (io), 46 PD3 (io), 47 PD4 (io), 48 PD5 (io), 49 PD6 (io), 50 PD7 (io), 51 PG0 (io), 52 PG1 (io), 53 PC0 (io), 54 PC1 (io), 55 PC2 (io), 56 PC3 (io), 57 PC4 (io), 58 PC5 (io), 59 NC (in) hidden, 60 NC (in) hidden, 61 NC (in) hidden, 62 NC (in) hidden, 63 PH0 (io), 64 PH1 (io), 65 PH2 (io), 66 PH3 (io), 67 NC (in) hidden, 68 PC6 (io), 69 PC7 (io), 70 PG2 (io), 71 PA7 (io), 72 PA6 (io), 73 PA5 (io), 74 PA4 (io), 75 PA3 (io), 76 PA2 (io), 77 PA1 (io), 78 PA0 (io), 79 NC (in) hidden, 80 VCC hidden, 81 GND hidden, 82 NC (in) hidden, 83 NC (in) hidden, 84 PH4 (io), 85 PH5 (io), 86 PH6 (io), 87 PH7 (io), 88 NC (in) hidden, 89 NC (in) hidden, 90 PF7 (io), 91 PF6 (io), 92 PF5 (io), 93 PF4 (io), 94 PF3 (io), 95 PF2 (io), 96 PF1 (io), 97 PF0 (io), 98 AREF, 99 AGND (power), 100 AVCC (power)

## ATmega3250P-20A
designator *  value ATmega3250P-20A
ki_keywords: AVR 8bit Microcontroller MegaAVR; ki_description: 20MHz, 32kB Flash, 2kB SRAM, 1kB EEPROM, JTAG, TQFP-100; ki_fp_filters: TQFP*14x14mm*P0.5mm*; Footprint: Package_QFP:TQFP-100_14x14mm_P0.5mm; Supplier: http://ww1.microchip.com/downloads/en/DeviceDoc/doc8023.pdf
footprint TQFP-100_14x14mm_P0.5mm
pins: 1 NC (in) hidden, 2 PE0 (io), 3 PE1 (io), 4 PE2 (io), 5 PE3 (io), 6 PE4 (io), 7 PE5 (io), 8 PE6 (io), 9 PE7 (io), 10 VCC (power), 11 GND (power), 12 NC (in) hidden, 13 PJ0 (io), 14 PJ1 (io), 15 NC (in) hidden, 16 NC (in) hidden, 17 NC (in) hidden, 18 NC (in) hidden, 19 PB0 (io), 20 PB1 (io), 21 PB2 (io), 22 PB3 (io), 23 PB4 (io), 24 PB5 (io), 25 PB6 (io), 26 PB7 (io), 27 NC (in) hidden, 28 PG3 (io), 29 PG4 (io), 30 PG5/~{{RESET}} (io), 31 VCC hidden, 32 GND hidden, 33 XTAL2 (out), 34 XTAL1 (in), 35 NC (in) hidden, 36 NC (in) hidden, 37 PJ2 (io), 38 PJ3 (io), 39 PJ4 (io), 40 PJ5 (io), 41 PJ6 (io), 42 NC (in) hidden, 43 PD0 (io), 44 PD1 (io), 45 PD2 (io), 46 PD3 (io), 47 PD4 (io), 48 PD5 (io), 49 PD6 (io), 50 PD7 (io), 51 PG0 (io), 52 PG1 (io), 53 PC0 (io), 54 PC1 (io), 55 PC2 (io), 56 PC3 (io), 57 PC4 (io), 58 PC5 (io), 59 NC (in) hidden, 60 NC (in) hidden, 61 NC (in) hidden, 62 NC (in) hidden, 63 PH0 (io), 64 PH1 (io), 65 PH2 (io), 66 PH3 (io), 67 NC (in) hidden, 68 PC6 (io), 69 PC7 (io), 70 PG2 (io), 71 PA7 (io), 72 PA6 (io), 73 PA5 (io), 74 PA4 (io), 75 PA3 (io), 76 PA2 (io), 77 PA1 (io), 78 PA0 (io), 79 NC (in) hidden, 80 VCC hidden, 81 GND hidden, 82 NC (in) hidden, 83 NC (in) hidden, 84 PH4 (io), 85 PH5 (io), 86 PH6 (io), 87 PH7 (io), 88 NC (in) hidden, 89 NC (in) hidden, 90 PF7 (io), 91 PF6 (io), 92 PF5 (io), 93 PF4 (io), 94 PF3 (io), 95 PF2 (io), 96 PF1 (io), 97 PF0 (io), 98 AREF, 99 AGND (power), 100 AVCC (power)

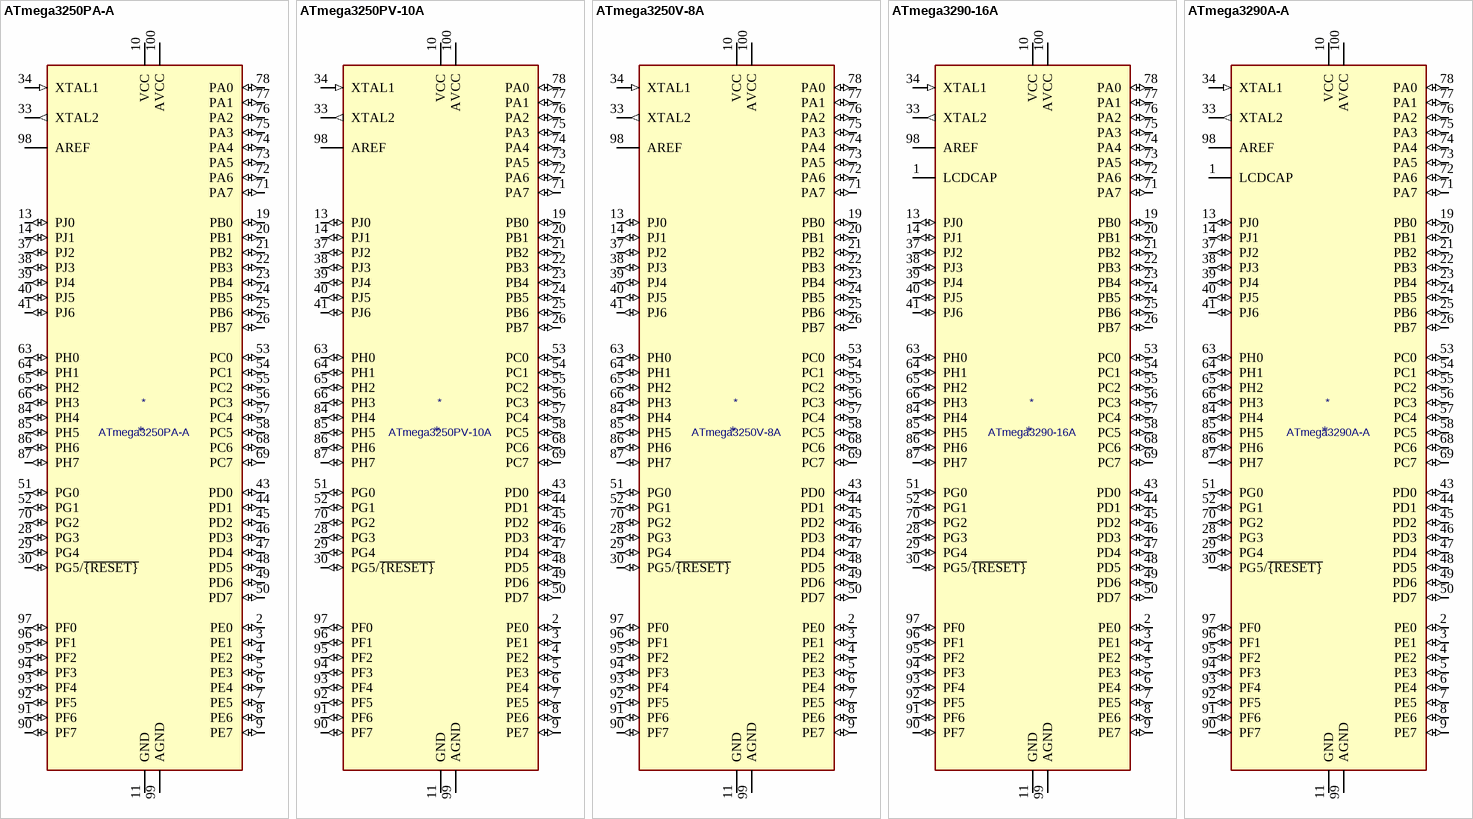
[diagram p26: symbols ATmega3250PA-A to ATmega3290A-A]

## ATmega3250PA-A
designator *  value ATmega3250PA-A
ki_keywords: AVR 8bit Microcontroller MegaAVR; ki_description: 20MHz, 32kB Flash, 2kB SRAM, 1kB EEPROM, JTAG, TQFP-100; ki_fp_filters: TQFP*14x14mm*P0.5mm*; Footprint: Package_QFP:TQFP-100_14x14mm_P0.5mm; Supplier: http://ww1.microchip.com/downloads/en/DeviceDoc/atmel-8285-8-bit-avr-microcontroller-atmega165a_pa_325a_pa_3250a_pa_645a_p_6450a_p_datasheet.pdf
footprint TQFP-100_14x14mm_P0.5mm
pins: 1 NC (in) hidden, 2 PE0 (io), 3 PE1 (io), 4 PE2 (io), 5 PE3 (io), 6 PE4 (io), 7 PE5 (io), 8 PE6 (io), 9 PE7 (io), 10 VCC (power), 11 GND (power), 12 NC (in) hidden, 13 PJ0 (io), 14 PJ1 (io), 15 NC (in) hidden, 16 NC (in) hidden, 17 NC (in) hidden, 18 NC (in) hidden, 19 PB0 (io), 20 PB1 (io), 21 PB2 (io), 22 PB3 (io), 23 PB4 (io), 24 PB5 (io), 25 PB6 (io), 26 PB7 (io), 27 NC (in) hidden, 28 PG3 (io), 29 PG4 (io), 30 PG5/~{{RESET}} (io), 31 VCC hidden, 32 GND hidden, 33 XTAL2 (out), 34 XTAL1 (in), 35 NC (in) hidden, 36 NC (in) hidden, 37 PJ2 (io), 38 PJ3 (io), 39 PJ4 (io), 40 PJ5 (io), 41 PJ6 (io), 42 NC (in) hidden, 43 PD0 (io), 44 PD1 (io), 45 PD2 (io), 46 PD3 (io), 47 PD4 (io), 48 PD5 (io), 49 PD6 (io), 50 PD7 (io), 51 PG0 (io), 52 PG1 (io), 53 PC0 (io), 54 PC1 (io), 55 PC2 (io), 56 PC3 (io), 57 PC4 (io), 58 PC5 (io), 59 NC (in) hidden, 60 NC (in) hidden, 61 NC (in) hidden, 62 NC (in) hidden, 63 PH0 (io), 64 PH1 (io), 65 PH2 (io), 66 PH3 (io), 67 NC (in) hidden, 68 PC6 (io), 69 PC7 (io), 70 PG2 (io), 71 PA7 (io), 72 PA6 (io), 73 PA5 (io), 74 PA4 (io), 75 PA3 (io), 76 PA2 (io), 77 PA1 (io), 78 PA0 (io), 79 NC (in) hidden, 80 VCC hidden, 81 GND hidden, 82 NC (in) hidden, 83 NC (in) hidden, 84 PH4 (io), 85 PH5 (io), 86 PH6 (io), 87 PH7 (io), 88 NC (in) hidden, 89 NC (in) hidden, 90 PF7 (io), 91 PF6 (io), 92 PF5 (io), 93 PF4 (io), 94 PF3 (io), 95 PF2 (io), 96 PF1 (io), 97 PF0 (io), 98 AREF, 99 AGND (power), 100 AVCC (power)